# Altium footprint library PCB_PASSIVE.PcbLib: 100 footprints (part 4 of 7)
Each footprint in its own frame and in the unit in brackets; x right, y up, seen from the top. Pads: shape width x height; smd on the part's side, far side on the other; paste and mask are expansions set on the pad; w line width, h text height; cw(c..) or ccw(c..) is an arc to the next point about the centre after c.
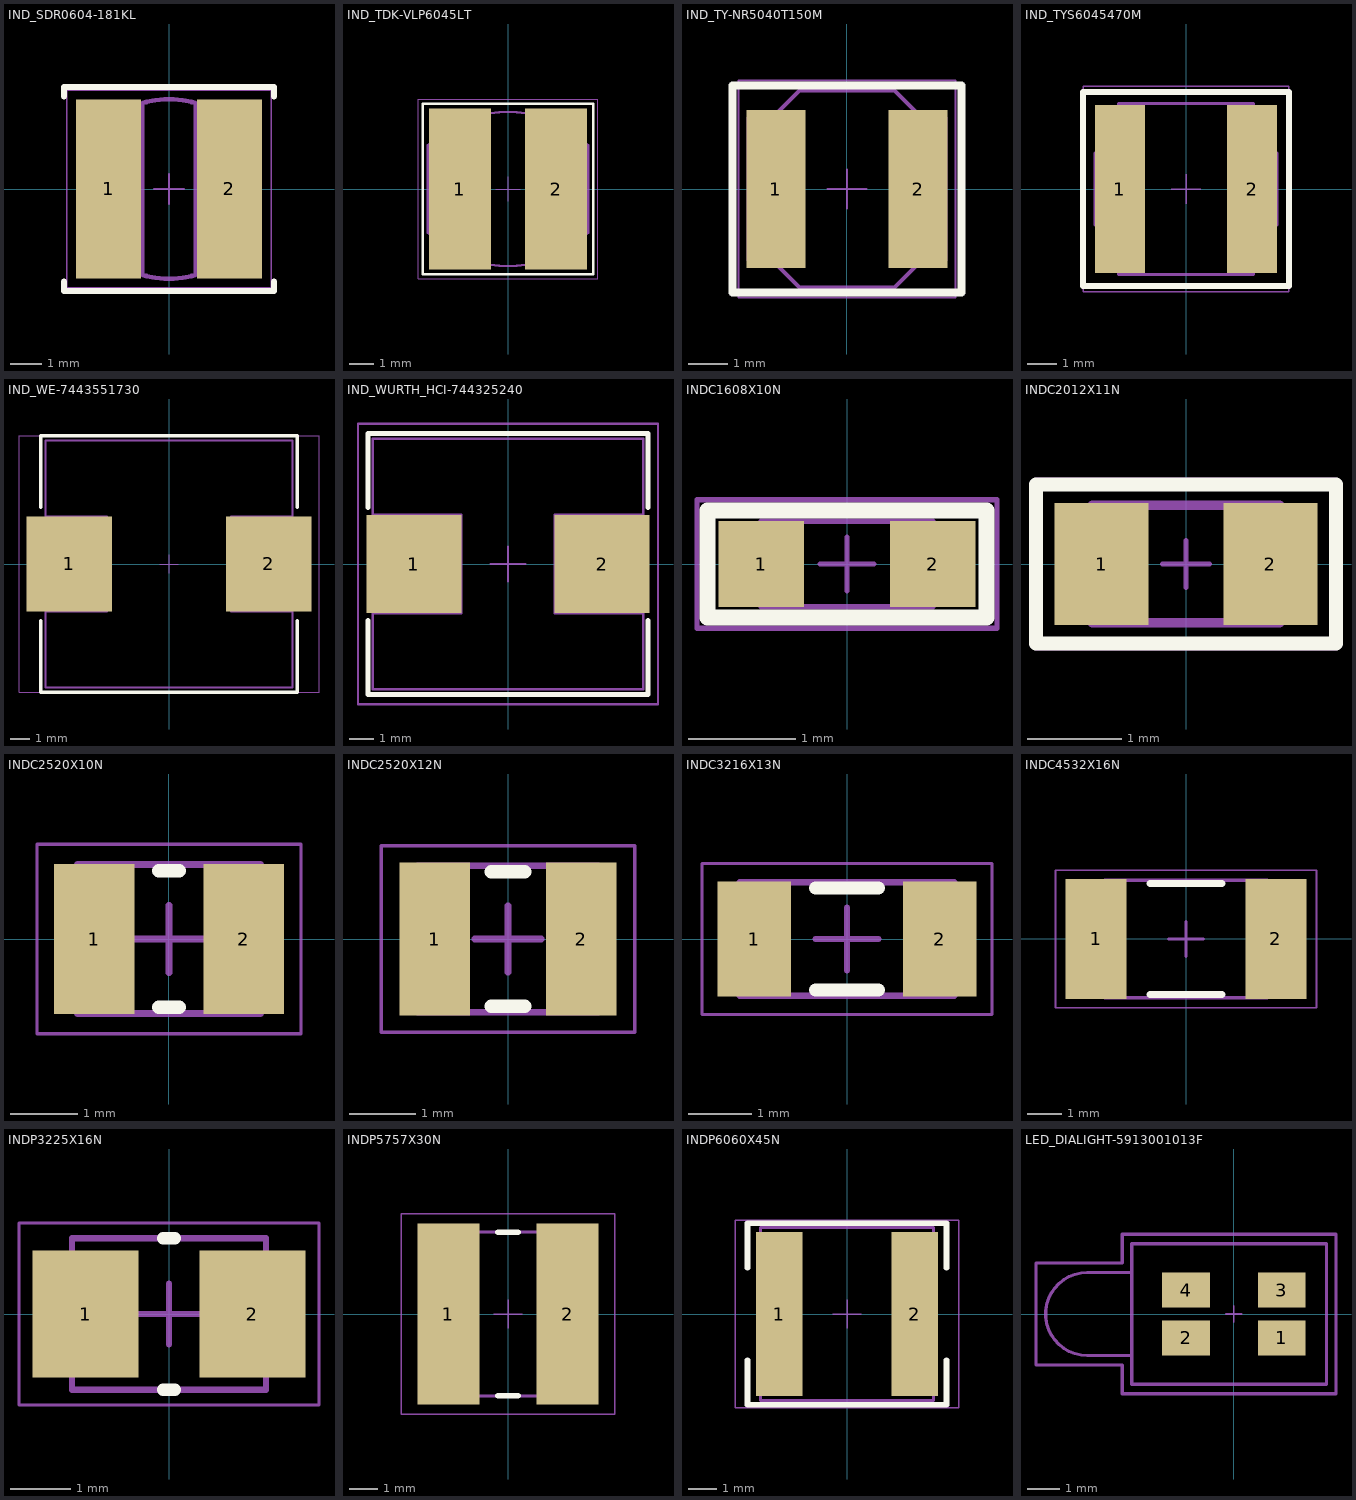
[diagram p3: the footprints below, top view; thin cyan lines are the x and y axes]

## IND_SDR0604-181KL [mm] "Inductor"
height 1.2
pads (2):
  rect 2.1x5.8 smd: 1(-1.95,0) 2(1.95,0)
Top Overlay:
  lines w0.2: -3.4,-3 -3.4,-3.3 3.4,-3.3 3.4,-3 ; -3.4,3 -3.4,3.3 3.4,3.3 3.4,3
Mechanical 11:
  text ".Designator" at -1.2,-0.1 h1
Mechanical 14:
  circle w0.15: c0,0 r2.907
  lines w0.2: -0.9,-2.7 -0.9,2.7 ; 0.9,-2.7 0.9,2.7
Mechanical 15:
  lines w0.05: -0.5,0 0.5,0 ; 0,-0.5 0,0.5 ; -3.3,-3.2 -3.3,3.2 3.3,3.2 3.3,-3.2 -3.3,-3.2
3D body "User Library-SDR0604.STEP": height 4.56, standoff 0.01, extent -2.754,-2.8 2.754,2.8

## IND_TDK-VLP6045LT [mm]
height 4.5
pads (2):
  rect 2.55x6.6 smd: 1(-1.975,0) 2(1.975,0)
Top Overlay:
  lines w0.1: -3.5,-3.5 -3.5,3.5 3.5,3.5 3.5,-3.5 -3.5,-3.5
Mechanical 11:
  text ".Designator" at -1,-0.5 h1
Mechanical 14:
  lines w0.1: -3.3,-1.8 ccw(c0,1.5) 3.3,-1.8 3.3,0 3.3,1.8 ccw(c0,-1.5) -3.3,1.8 -3.3,0 -3.3,-1.8
Mechanical 15:
  lines w0.05: -0.5,0 0.5,0 ; 0,-0.5 0,0.5 ; -3.7,-3.7 -3.7,3.7 3.7,3.7 3.7,-3.7 -3.7,-3.7
3D body: height 4.5, standoff 0, extent -3.4,-3.4 3.4,3.4

## IND_TY-NR5040T150M [mm]
height 4
pads (2):
  rect 1.5x4 smd: 1(-1.8,0) 2(1.8,0)
Top Overlay:
  lines w0.2: -2.9,-2.625 -2.725,-2.625 0,-2.625 2.725,-2.625 2.9,-2.625 2.9,-1.75 2.9,0 2.9,1.75 2.9,2.625 2.725,2.625 0,2.625 -2.725,2.625 -2.9,2.625 -2.9,1.75 -2.9,0 -2.9,-1.75 -2.9,-2.625
Mechanical 11:
  text ".Designator" at -0.575,-0.375 h1
Mechanical 14:
  lines w0.1: -1.9,-1.8 -2.5,-1.8 -2.5,1.3 -2.5,1.8 -1.9,1.8 ; 1.9,-1.8 2.5,-1.8 2.5,1.3 2.5,1.8 1.9,1.8 ; -2.2,-1.5 -1.2,-2.5 1.2,-2.5 2.2,-1.5 2.2,0 2.2,1.5 1.2,2.5 -1.2,2.5 -2.2,1.5 -2.2,0 -2.2,-1.5
Mechanical 15:
  lines w0.05: -0.5,0 0,0 ; 0,-0.5 0,0 ; 0,0.5 0,0 ; 0.5,0 0,0 ; -2.75,-2.75 0,-2.75 2.75,-2.75 2.75,0 2.75,2.75 0,2.75 -2.75,2.75 -2.75,0 -2.75,-2.75
3D body: height 4.1, standoff 0, extent -2.2,-2.5 2.2,2.5

## IND_TYS6045470M [mm] "Inductor, shielded"
height 4.5
pads (2):
  rect 1.7x5.7 smd: 1(-2.25,0) 2(2.25,0)
Top Overlay:
  lines w0.2: -3.5,-3.3 -3.5,0 -3.5,3.3 0,3.3 3.5,3.3 3.5,0 3.5,-3.3 0,-3.3 -3.5,-3.3
Mechanical 11:
  text ".Designator" at -1.5,-0.4 h1
Mechanical 14:
  lines w0.1: -3.1,-1.2 -2.3,-2 -2.3,-2.9 2.3,-2.9 2.3,-2 3.1,-1.2 3.1,1.2 2.3,2 2.3,2.9 -2.3,2.9 -2.3,2 -3.1,1.2 -3.1,-1.2
Mechanical 15:
  lines w0.05: -0.5,0 0.5,0 ; 0,-0.5 0,0.5 ; -3.5,-3.5 0,-3.5 3.5,-3.5 3.5,0 3.5,3.5 0,3.5 -3.5,3.5 -3.5,0 -3.5,-3.5
3D body: height 4.5, standoff 0, extent -3,-3 3,3

## IND_WE-7443551730 [mm] "Inductor, 12,8X12,8X6m5 mm"
height 6.5
pads (2):
  rect 4.5x5 smd: 1(-5.25,0) 2(5.25,0)
Top Overlay:
  lines w0.2: -6.75,-3 -6.75,-6.75 6.75,-6.75 6.75,-3 ; -6.75,3 -6.75,6.75 6.75,6.75 6.75,3
Mechanical 11:
  text ".Designator" at -4.3,-0.4 h1
Mechanical 14:
  lines w0.1: -6.5,-2.5 -3.25,-2.5 -3.25,2.5 -6.5,2.5 ; 6.5,-2.5 3.25,-2.5 3.25,2.5 6.5,2.5 ; -6.5,-6.5 6.5,-6.5 6.5,6.5 -6.5,6.5 -6.5,-6.5
Mechanical 15:
  lines w0.05: -0.5,0 0.5,0 ; 0,-0.5 0,0.5 ; -7.9,-6.75 -7.9,6.75 7.9,6.75 7.9,-6.75 -7.9,-6.75
3D body "WE-HCI_1365_7443551.stp": height 6.21, standoff 0.01, extent -7.1,-6.4 7.1,6.4

## IND_WURTH_HCI-744325240 [mm]
height 5
pads (2):
  rect 3.85x4 smd: 1(-3.825,0) 2(3.825,0)
Top Overlay:
  lines w0.2: -5.7,-2.3 -5.7,-5.3 -4.1,-5.3 5.7,-5.3 5.7,-2.3 ; -5.7,2.3 -5.7,5.3 -4.1,5.3 5.7,5.3 5.7,2.3
Mechanical 11:
  text ".Designator" at -1.7,-0.3 h1
Mechanical 14:
  lines w0.1: -5.5,-2 -1.9,-2 -1.9,2 -5.5,2 ; 5.5,-2 1.9,-2 1.9,2 5.5,2 ; -5.5,-5.1 5.5,-5.1 5.5,5.1 -5.5,5.1 -5.5,0 -5.5,-5.1
Mechanical 15:
  lines w0.1: -0.7,0 0,0 ; 0,-0.7 0,0 ; 0,0.7 0,0 ; 0.7,0 0,0 ; -6.1,-5.7 -6.1,5.7 6.1,5.7 6.1,-5.7 -6.1,-5.7
3D body "STEP-WE-HCI-1050-rev1.stp": height 5.01, standoff 0.01, extent -5.5,-5.1 5.5,5.1

## INDC1608X10N [mm] "Chip Inductor, 2-Leads, Body 1,60x0,80mm, IPC Medium Density"
pads (2):
  rect 0.8x0.8 smd mask+0.05: 1(-0.8,0) 2(0.8,0)
Top Overlay:
  lines w0.15: -1.3,-0.5 1.3,-0.5 1.3,0.5 -1.3,0.5 -1.3,-0.5
Mechanical 11:
  text ".Designator" at -1.4,0.8 h0.3
Mechanical 14:
  lines w0.05: -0.6,-0.4 -0.6,0.4 ; 0.6,-0.4 0.6,0.4 ; -0.8,-0.4 -0.8,0.4 0.8,0.4 0.8,-0.4 -0.8,-0.4
Mechanical 15:
  lines w0.05: -0.25,0 0.25,0 ; 0,-0.25 0,0.25 ; -1.4,-0.6 -1.4,0.6 1.4,0.6 1.4,-0.6 -1.4,-0.6
3D body "L0603.STEP": height 0.95, standoff 0, extent -0.8,-0.4 0.8,0.4

## INDC2012X11N [mm] "Chip Inductor, 2-Leads, Body 2,00x1,25mm, IPC Low Density"
height 1.05
pads (2):
  rect 1x1.3 smd: 1(-0.9,0) 2(0.9,0)
Top Overlay:
  lines w0.15: -1.6,-0.85 1.6,-0.85 1.6,0.85 -1.6,0.85 -1.6,-0.85
Mechanical 11:
  text ".Designator" at -1.5,1.1 h0.3
Mechanical 14:
  lines w0.1: -0.6,-0.625 -0.6,0.625 ; 0.6,-0.625 0.6,0.625 ; -1,-0.625 -1,0.625 1,0.625 1,-0.625 -1,-0.625
Mechanical 15:
  lines w0.05: -0.25,0 0.25,0 ; 0,-0.25 0,0.25 ; -1.6,-0.9 1.6,-0.9 1.6,0.9 -1.6,0.9 -1.6,-0.9
3D body "User Library-Chip InductorINDC2012X95N.STEP": height 1, standoff 0.05, extent -1,-0.6 1,0.6

## INDC2520X10N [mm] "Chip Inductor, 2-Leads, Body 2,50x2,00mm, IPC Medium Density"
height 1
pads (2):
  rect 1.19x2.22 smd: 1(-1.105,0) 2(1.105,0)
Top Overlay:
  lines w0.2: -0.15,-1.01 0.15,-1.01 ; -0.15,1.01 0.15,1.01
Mechanical 11:
  text ".Designator" at -0.5,-0.525 h1
Mechanical 14:
  lines w0.1: -1.35,-1.1 -1.35,1.1 1.35,1.1 1.35,-1.1 -1.35,-1.1
Mechanical 15:
  lines w0.05: -1.95,-1.4 -1.95,1.4 1.95,1.4 1.95,-1.4 -1.95,-1.4
  lines w0.1: -0.5,0 0.5,0 ; 0,-0.5 0,0.5
3D body "INDC2520X10N.step": height 1, standoff 0, extent -1.35,-1.1 1.35,1.1

## INDC2520X12N [mm] "Chip Inductor, 2-Leads, Body 2,50x2,00mm, IPC Medium Density"
height 1.2
pads (2):
  rect 1.06x2.3 smd: 1(-1.1,0) 2(1.1,0)
Top Overlay:
  lines w0.2: -0.25,-1.01 0.25,-1.01 ; -0.25,1.01 0.25,1.01
Mechanical 11:
  text ".Designator" at -1.2,-0.325 h1
Mechanical 14:
  lines w0.1: -1,-1.1 -1,1.1 ; 1,-1.1 1,1.1 ; -1.35,-1.1 -1.35,1.1 1.35,1.1 1.35,-1.1 -1.35,-1.1
Mechanical 15:
  lines w0.05: -1.9,-1.4 -1.9,1.4 1.9,1.4 1.9,-1.4 -1.9,-1.4
  lines w0.1: -0.5,0 0.5,0 ; 0,-0.5 0,0.5
3D body "INDC2520X12N.step": height 1.2, standoff 0, extent -1.35,-1.1 1.35,1.1

## INDC3216X13N [mm] "Chip Inductor, 2-Leads, Body 3,20x1,60mm, IPC Medium Density"
height 1.3
pads (2):
  rect 1.17x1.82 smd: 1(-1.47,0) 2(1.47,0)
Top Overlay:
  lines w0.2: -0.5,-0.81 0.5,-0.81 ; -0.5,0.81 0.5,0.81
Mechanical 11:
  text ".Designator" at -0.8,-0.3 h1
Mechanical 14:
  lines w0.1: -1.7,-0.9 -1.7,0.9 1.7,0.9 1.7,-0.9 -1.7,-0.9
Mechanical 15:
  lines w0.05: -2.3,-1.2 -2.3,1.2 2.3,1.2 2.3,-1.2 -2.3,-1.2
  lines w0.1: -0.5,0 0.5,0 ; 0,-0.5 0,0.5
3D body "INDC3216X13N.step": height 1.3, standoff 0, extent -1.7,-0.9 1.7,0.9

## INDC4532X16N [mm] "Chip Inductor, 2-Leads, Body 4,55x3,24mm, IPC Medium Density"
height 1.55
pads (2):
  rect 1.78x3.5 smd: 1(-2.615,0) 2(2.615,0)
Top Overlay:
  lines w0.2: -1.05,-1.62 1.05,-1.62 ; -1.05,1.62 1.05,1.62
Mechanical 11:
  text ".Designator" at -1.9,-0.1 h0.3
Mechanical 14:
  lines w0.1: -2.365,-1.705 2.365,-1.705 2.365,1.705 -2.365,1.705 -2.365,-1.705
Mechanical 15:
  lines w0.05: -3.8,-2 3.8,-2 3.8,2 -3.8,2 -3.8,-2
  lines w0.1: -0.5,0 0.5,0 ; 0,-0.5 0,0.5
3D body "SW3dPS-1812L.STEP": height 1.34, standoff 0, extent -2.365,-1.705 2.365,1.705

## INDP3225X16N [mm] "Precision Wire Wound Inductor, 2-Leads, Body 3,20x2,50mm, IPC Medium Density"
height 1.55
pads (2):
  rect 1.75x2.1 smd: 1(-1.375,0) 2(1.375,0)
Top Overlay:
  lines w0.2: -0.1,-1.25 0.1,-1.25 ; -0.1,1.25 0.1,1.25
Mechanical 11:
  text ".Designator" at -1.8,-0.1 h0.3
Mechanical 14:
  lines w0.1: -1.6,-1.25 1.6,-1.25 1.6,1.25 -1.6,1.25 -1.6,-1.25
Mechanical 15:
  lines w0.05: -2.475,-1.5 2.475,-1.5 2.475,1.5 -2.475,1.5 -2.475,-1.5
  lines w0.1: -0.5,0 0.5,0 ; 0,-0.5 0,0.5
3D body "User Library-LQH32PN_sw.STEP": height 1.55, standoff 0, extent -1.6,-1.25 1.6,1.25

## INDP5757X30N [mm] "Precision Wire Wound Inductor, 2-Leads, Body 5,70x5,70mm, IPC Medium Density"
height 3
pads (2):
  rect 2.15x6.3 smd: 1(-2.075,0) 2(2.075,0)
Top Overlay:
  lines w0.2: -0.35,-2.85 0.35,-2.85 ; -0.35,2.85 0.35,2.85
Mechanical 11:
  text ".Designator" at -1.9,-0.2 h0.3
Mechanical 14:
  lines w0.1: -2.85,-2.85 2.85,-2.85 2.85,2.85 -2.85,2.85 -2.85,-2.85
Mechanical 15:
  lines w0.05: -0.5,0 0.5,0 ; 0,-0.5 0,0.5 ; -3.725,-3.5 3.725,-3.5 3.725,3.5 -3.725,3.5 -3.725,-3.5
3D body "User Library-cdrh5d28.STEP": height 2.9, standoff -0.1, extent -3,-3 3,3

## INDP6060X45N [mm] "Precision Wire Wound Inductor, 2-Leads, Body 6,00x6,00mm, IPC Medium Density"
height 4.5
pads (2):
  rect 1.6x5.7 smd: 1(-2.35,0) 2(2.35,0)
Top Overlay:
  lines w0.2: -3.45,-1.6 -3.45,-3.15 3.45,-3.15 3.45,-1.6 ; -3.45,1.6 -3.45,3.15 3.45,3.15 3.45,1.6
Mechanical 11:
  text ".Designator" at -1.6,-0.1 h0.3
Mechanical 14:
  lines w0.1: -3,-3 3,-3 3,3 -3,3 -3,-3
Mechanical 15:
  lines w0.05: -0.5,0 0.5,0 ; 0,-0.5 0,0.5 ; -3.875,-3.25 3.875,-3.25 3.875,3.25 -3.875,3.25 -3.875,-3.25
3D body: height 4.5, standoff 0, extent -3,-3 3,3

## LED_DIALIGHT-5913001013F [mm] "Bicolor led, SMD"
height 15
pads (4):
  rect 1.5x1.1 smd: 1(1.5,-0.75) 2(-1.5,-0.75) 3(1.5,0.75) 4(-1.5,0.75)
Mechanical 11:
  text ".Designator" at -2.5,-0.1 h1
Mechanical 14:
  lines w0.1: -3.2,-1.3 -4.6,-1.3 cw(c-4.6,0) -4.6,1.3 -3.2,1.3 ; -3.2,-2.2 2.9,-2.2 2.9,2.2 -3.2,2.2 -3.2,-2.2
Mechanical 15:
  lines w0.05: -0.25,0 0.25,0 ; 0,-0.25 0,0.25
  lines w0.1: -6.2,-1.6 -3.5,-1.6 -3.5,-2.5 3.2,-2.5 3.2,2.5 -3.5,2.5 -3.5,1.6 -6.2,1.6 -6.2,-1.6
3D body "591_prism_multi(ROUND).stp": height 4.94, standoff 0.01, extent -5.913,-2.15 2.913,2.168